# Altium footprint library MH_DA_THU_VIEN_16122016.PcbLib: 531 footprints (part 15 of 34)
Each footprint in its own frame and in the unit in brackets; x right, y up, seen from the top. Pads: shape width x height; smd on the part's side, far side on the other; paste and mask are expansions set on the pad; w line width, h text height; cw(c..) or ccw(c..) is an arc to the next point about the centre after c.
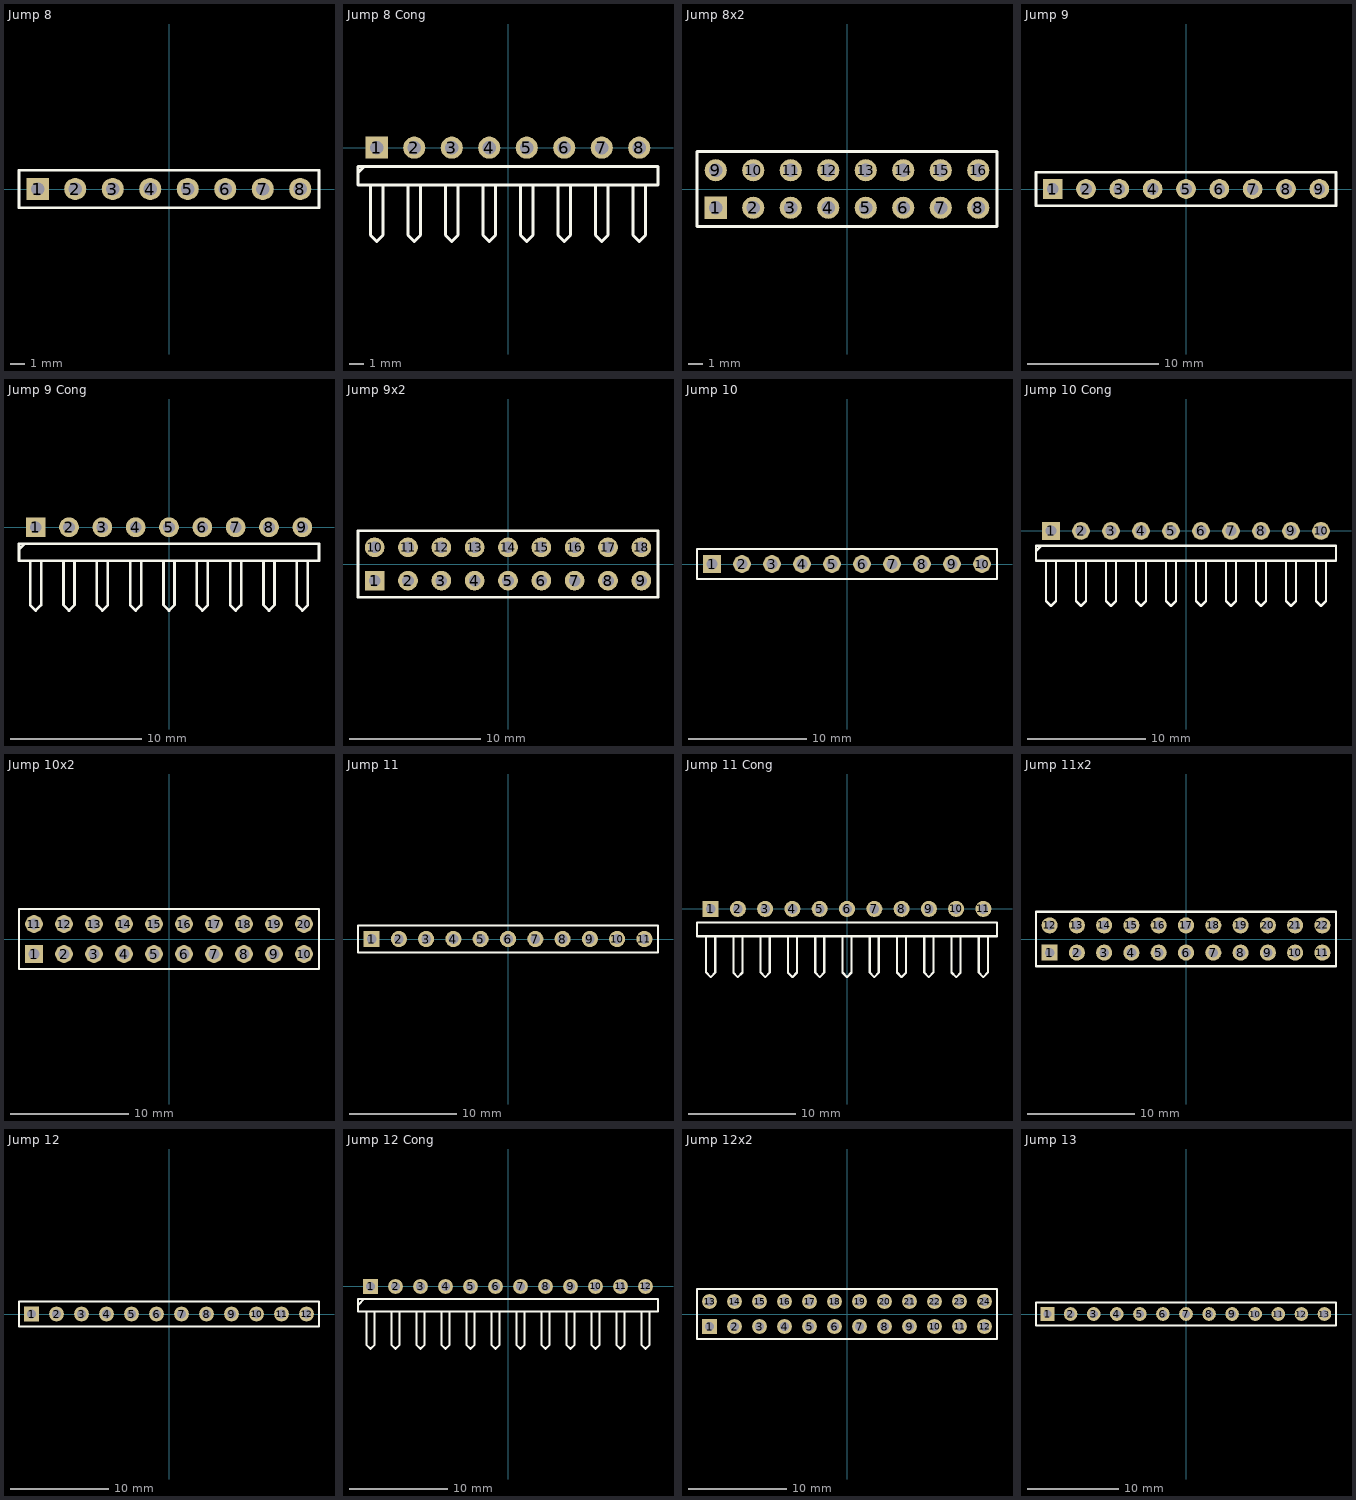
[diagram p14: the footprints below, top view; thin cyan lines are the x and y axes]

## Jump 8 [mm]
pads (8):
  rect 1.5x1.5 hole 0.9: 1(-8.89,0)
  round 1.5 hole 0.9: 2(-6.35,0) 3(-3.81,0) 4(-1.27,0) 5(1.27,0) 6(3.81,0) 7(6.35,0) 8(8.89,0)
Top Overlay:
  lines w0.2: -10.16,-1.27 -10.16,1.27 10.16,1.27 10.16,-1.27 -10.16,-1.27
3D body: height 7, standoff -1, extent 3.404,-0.406 4.2,0.392
3D body: height 1.5, standoff 0, extent 2.54,-1.27 5.08,1.27
3D body: height 7, standoff -1, extent 5.944,-0.406 6.74,0.392
3D body: height 1.5, standoff 0, extent 5.08,-1.27 7.62,1.27
3D body: height 7, standoff -1, extent 8.484,-0.406 9.28,0.392
3D body: height 1.5, standoff 0, extent 7.62,-1.27 10.16,1.27
3D body: height 7, standoff -1, extent -9.296,-0.406 -8.5,0.392
3D body: height 1.5, standoff 0, extent -10.16,-1.27 -7.62,1.27
3D body: height 7, standoff -1, extent -6.756,-0.406 -5.96,0.392
3D body: height 1.5, standoff 0, extent -7.62,-1.27 -5.08,1.27
3D body: height 7, standoff -1, extent -4.216,-0.406 -3.42,0.392
3D body: height 1.5, standoff 0, extent -5.08,-1.27 -2.54,1.27
3D body: height 7, standoff -1, extent -1.676,-0.406 -0.88,0.392
3D body: height 1.5, standoff 0, extent -2.54,-1.27 0,1.27
3D body: height 7, standoff -1, extent 0.864,-0.406 1.66,0.392
3D body: height 1.5, standoff 0, extent 0,-1.27 2.54,1.27

## Jump 8 Cong [mm]
pads (8):
  rect 1.5x1.5 hole 0.9: 1(-8.89,0)
  round 1.5 hole 0.9: 2(-6.35,0) 3(-3.81,0) 4(-1.27,0) 5(1.27,0) 6(3.81,0) 7(6.35,0) 8(8.89,0)
Top Overlay:
  lines w0.2: -10.16,-1.693 -9.737,-1.27 ; -9.313,-2.54 -9.313,-5.927 -8.89,-6.35 -8.467,-5.927 -8.467,-2.54 ; -6.773,-2.54 -6.773,-5.927 -6.35,-6.35 -5.927,-5.927 -5.927,-2.54 ; -4.233,-2.54 -4.233,-5.927 -3.81,-6.35 -3.387,-5.927 -3.387,-2.54 ; -1.693,-2.54 -1.693,-5.927 -1.27,-6.35 -0.847,-5.927 -0.847,-2.54 ; 0.847,-2.54 0.847,-5.927 1.27,-6.35 1.693,-5.927 1.693,-2.54 ; 3.387,-2.54 3.387,-5.927 3.81,-6.35 4.233,-5.927 4.233,-2.54 ; 5.927,-2.54 5.927,-5.927 6.35,-6.35 6.773,-5.927 6.773,-2.54 ; 8.467,-2.54 8.467,-5.927 8.89,-6.35 9.313,-5.927 9.313,-2.54 ; -10.16,-2.54 10.16,-2.54 10.16,-1.27 -10.16,-1.27 -10.16,-2.54
3D body: height 4.33, standoff -3, extent 5.08,-7 10.16,1.27
3D body: height 4.33, standoff -3, extent 0,-7 5.08,1.27
3D body: height 4.33, standoff -3, extent -5.08,-7 0,1.27
3D body: height 4.33, standoff -3, extent -10.16,-7 -5.08,1.27

## Jump 8x2 [mm]
pads (16):
  rect 1.5x1.5 hole 0.9: 1(-8.89,-1.27)
  round 1.5 hole 0.9: 2(-6.35,-1.27) 3(-3.81,-1.27) 4(-1.27,-1.27) 5(1.27,-1.27) 6(3.81,-1.27) 7(6.35,-1.27) 8(8.89,-1.27) 9(-8.89,1.27) 10(-6.35,1.27) 11(-3.81,1.27) 12(-1.27,1.27) 13(1.27,1.27) 14(3.81,1.27) 15(6.35,1.27) 16(8.89,1.27)
Top Overlay:
  lines w0.2: -10.16,-2.54 10.16,-2.54 10.16,2.54 -10.16,2.54 -10.16,-2.54
3D body: height 1.5, standoff 0, extent -10.16,-2.54 -7.62,0
3D body: height 1.5, standoff 0, extent -10.16,0 -7.62,2.54
3D body: height 1.5, standoff 0, extent -7.62,-2.54 -5.08,0
3D body: height 1.5, standoff 0, extent -7.62,0 -5.08,2.54
3D body: height 1.5, standoff 0, extent -5.08,-2.54 -2.54,0
3D body: height 1.5, standoff 0, extent -5.08,0 -2.54,2.54
3D body: height 1.5, standoff 0, extent -2.54,-2.54 0,0
3D body: height 1.5, standoff 0, extent -2.54,0 0,2.54
3D body: height 1.5, standoff 0, extent 0,-2.54 2.54,0
3D body: height 1.5, standoff 0, extent 0,0 2.54,2.54
3D body: height 1.5, standoff 0, extent 2.54,-2.54 5.08,0
3D body: height 1.5, standoff 0, extent 2.54,0 5.08,2.54
3D body: height 1.5, standoff 0, extent 5.08,-2.54 7.62,0
3D body: height 1.5, standoff 0, extent 5.08,0 7.62,2.54
3D body: height 1.5, standoff 0, extent 7.62,-2.54 10.16,0
3D body: height 1.5, standoff 0, extent 7.62,0 10.16,2.54

## Jump 9 [mm]
pads (9):
  rect 1.5x1.5 hole 0.9: 1(-10.16,0)
  round 1.5 hole 0.9: 2(-7.62,0) 3(-5.08,0) 4(-2.54,0) 5(0,0) 6(2.54,0) 7(5.08,0) 8(7.62,0) 9(10.16,0)
Top Overlay:
  lines w0.2: -11.43,-1.27 -11.43,1.27 11.43,1.27 11.43,-1.27 -11.43,-1.27
3D body: height 7, standoff -1, extent 2.134,-0.406 2.93,0.392
3D body: height 1.5, standoff 0, extent 1.27,-1.27 3.81,1.27
3D body: height 7, standoff -1, extent 4.674,-0.406 5.47,0.392
3D body: height 1.5, standoff 0, extent 3.81,-1.27 6.35,1.27
3D body: height 7, standoff -1, extent 7.214,-0.406 8.01,0.392
3D body: height 1.5, standoff 0, extent 6.35,-1.27 8.89,1.27
3D body: height 7, standoff -1, extent 9.754,-0.406 10.55,0.392
3D body: height 1.5, standoff 0, extent 8.89,-1.27 11.43,1.27
3D body: height 7, standoff -1, extent -10.566,-0.406 -9.77,0.392
3D body: height 1.5, standoff 0, extent -11.43,-1.27 -8.89,1.27
3D body: height 7, standoff -1, extent -8.026,-0.406 -7.23,0.392
3D body: height 1.5, standoff 0, extent -8.89,-1.27 -6.35,1.27
3D body: height 7, standoff -1, extent -5.486,-0.406 -4.69,0.392
3D body: height 1.5, standoff 0, extent -6.35,-1.27 -3.81,1.27
3D body: height 7, standoff -1, extent -2.946,-0.406 -2.15,0.392
3D body: height 1.5, standoff 0, extent -3.81,-1.27 -1.27,1.27
3D body: height 7, standoff -1, extent -0.406,-0.406 0.39,0.392
3D body: height 1.5, standoff 0, extent -1.27,-1.27 1.27,1.27

## Jump 9 Cong [mm]
pads (9):
  rect 1.5x1.5 hole 0.9: 1(-10.16,0)
  round 1.5 hole 0.9: 2(-7.62,0) 3(-5.08,0) 4(-2.54,0) 5(0,0) 6(2.54,0) 7(5.08,0) 8(7.62,0) 9(10.16,0)
Top Overlay:
  lines w0.2: -11.43,-1.693 -11.007,-1.27 ; -10.583,-2.54 -10.583,-5.927 -10.16,-6.35 -9.737,-5.927 -9.737,-2.54 ; -8.043,-2.54 -8.043,-5.927 -7.62,-6.35 -7.197,-5.927 -7.197,-2.54 ; -5.503,-2.54 -5.503,-5.927 -5.08,-6.35 -4.657,-5.927 -4.657,-2.54 ; -2.963,-2.54 -2.963,-5.927 -2.54,-6.35 -2.117,-5.927 -2.117,-2.54 ; -0.423,-2.54 -0.423,-5.927 0,-6.35 0.423,-5.927 0.423,-2.54 ; 2.117,-2.54 2.117,-5.927 2.54,-6.35 2.963,-5.927 2.963,-2.54 ; 4.657,-2.54 4.657,-5.927 5.08,-6.35 5.503,-5.927 5.503,-2.54 ; 7.197,-2.54 7.197,-5.927 7.62,-6.35 8.043,-5.927 8.043,-2.54 ; 9.737,-2.54 9.737,-5.927 10.16,-6.35 10.583,-5.927 10.583,-2.54 ; -11.43,-2.54 -11.43,-1.27 11.43,-1.27 11.43,-2.54 -11.43,-2.54
3D body: height 4.33, standoff -3, extent -1.27,-7 3.81,1.27
3D body: height 4.33, standoff -3, extent -6.35,-7 -1.27,1.27
3D body: height 4.33, standoff -3, extent -11.43,-7 -6.35,1.27
3D body: height 4.33, standoff -3, extent 3.81,-7 11.43,1.27

## Jump 9x2 [mm]
pads (18):
  rect 1.5x1.5 hole 0.9: 1(-10.16,-1.27)
  round 1.5 hole 0.9: 2(-7.62,-1.27) 3(-5.08,-1.27) 4(-2.54,-1.27) 5(0,-1.27) 6(2.54,-1.27) 7(5.08,-1.27) 8(7.62,-1.27) 9(10.16,-1.27) 10(-10.16,1.27) 11(-7.62,1.27) 12(-5.08,1.27) 13(-2.54,1.27) 14(0,1.27) 15(2.54,1.27) 16(5.08,1.27) 17(7.62,1.27) 18(10.16,1.27)
Top Overlay:
  lines w0.2: -11.43,-2.54 11.43,-2.54 11.43,2.54 -11.43,2.54 -11.43,-2.54
3D body: height 1.5, standoff 0, extent -11.43,-2.54 -8.89,0
3D body: height 1.5, standoff 0, extent -11.43,0 -8.89,2.54
3D body: height 1.5, standoff 0, extent -8.89,-2.54 -6.35,0
3D body: height 1.5, standoff 0, extent -8.89,0 -6.35,2.54
3D body: height 1.5, standoff 0, extent -6.35,-2.54 -3.81,0
3D body: height 1.5, standoff 0, extent -6.35,0 -3.81,2.54
3D body: height 1.5, standoff 0, extent -3.81,-2.54 -1.27,0
3D body: height 1.5, standoff 0, extent -3.81,0 -1.27,2.54
3D body: height 1.5, standoff 0, extent -1.27,-2.54 1.27,0
3D body: height 1.5, standoff 0, extent -1.27,0 1.27,2.54
3D body: height 1.5, standoff 0, extent 1.27,-2.54 3.81,0
3D body: height 1.5, standoff 0, extent 1.27,0 3.81,2.54
3D body: height 1.5, standoff 0, extent 3.81,-2.54 6.35,0
3D body: height 1.5, standoff 0, extent 3.81,0 6.35,2.54
3D body: height 1.5, standoff 0, extent 6.35,-2.54 8.89,0
3D body: height 1.5, standoff 0, extent 6.35,0 8.89,2.54
3D body: height 1.5, standoff 0, extent 8.89,-2.54 11.43,0
3D body: height 1.5, standoff 0, extent 8.89,0 11.43,2.54

## Jump 10 [mm]
pads (10):
  rect 1.5x1.5 hole 0.9: 1(-11.43,0)
  round 1.5 hole 0.9: 2(-8.89,0) 3(-6.35,0) 4(-3.81,0) 5(-1.27,0) 6(1.27,0) 7(3.81,0) 8(6.35,0) 9(8.89,0) 10(11.43,0)
Top Overlay:
  lines w0.2: -12.7,-1.27 -12.7,1.27 -10.795,1.27 12.7,1.27 12.7,-1.27 -12.7,-1.27
3D body: height 1.5, standoff 0, extent -2.54,-1.27 0,1.27
3D body: height 7, standoff -1, extent -1.676,-0.406 -0.88,0.392
3D body: height 1.5, standoff 0, extent -5.08,-1.27 -2.54,1.27
3D body: height 7, standoff -1, extent -4.216,-0.406 -3.42,0.392
3D body: height 1.5, standoff 0, extent -7.62,-1.27 -5.08,1.27
3D body: height 7, standoff -1, extent -6.756,-0.406 -5.96,0.392
3D body: height 1.5, standoff 0, extent -10.16,-1.27 -7.62,1.27
3D body: height 7, standoff -1, extent -9.296,-0.406 -8.5,0.392
3D body: height 1.5, standoff 0, extent -12.7,-1.27 -10.16,1.27
3D body: height 7, standoff -1, extent -11.836,-0.406 -11.04,0.392
3D body: height 1.5, standoff 0, extent 10.16,-1.27 12.7,1.27
3D body: height 7, standoff -1, extent 11.024,-0.406 11.82,0.392
3D body: height 1.5, standoff 0, extent 7.62,-1.27 10.16,1.27
3D body: height 7, standoff -1, extent 8.484,-0.406 9.28,0.392
3D body: height 1.5, standoff 0, extent 5.08,-1.27 7.62,1.27
3D body: height 7, standoff -1, extent 5.944,-0.406 6.74,0.392
3D body: height 1.5, standoff 0, extent 2.54,-1.27 5.08,1.27
3D body: height 7, standoff -1, extent 3.404,-0.406 4.2,0.392
3D body: height 1.5, standoff 0, extent 0,-1.27 2.54,1.27
3D body: height 7, standoff -1, extent 0.864,-0.406 1.66,0.392

## Jump 10 Cong [mm]
pads (10):
  rect 1.5x1.5 hole 0.9: 1(-11.43,0)
  round 1.5 hole 0.9: 2(-8.89,0) 3(-6.35,0) 4(-3.81,0) 5(-1.27,0) 6(1.27,0) 7(3.81,0) 8(6.35,0) 9(8.89,0) 10(11.43,0)
Top Overlay:
  lines w0.2: -12.7,-1.693 -12.277,-1.27 ; -11.853,-2.54 -11.853,-5.927 -11.43,-6.35 -11.007,-5.927 -11.007,-2.54 ; -9.313,-2.54 -9.313,-5.927 -8.89,-6.35 -8.467,-5.927 -8.467,-2.54 ; -6.773,-2.54 -6.773,-5.927 -6.35,-6.35 -5.927,-5.927 -5.927,-2.54 ; -4.233,-2.54 -4.233,-5.927 -3.81,-6.35 -3.387,-5.927 -3.387,-2.54 ; -1.693,-2.54 -1.693,-5.927 -1.27,-6.35 -0.847,-5.927 -0.847,-2.54 ; 0.847,-2.54 0.847,-5.927 1.27,-6.35 1.693,-5.927 1.693,-2.54 ; 3.387,-2.54 3.387,-5.927 3.81,-6.35 4.233,-5.927 4.233,-2.54 ; 5.927,-2.54 5.927,-5.927 6.35,-6.35 6.773,-5.927 6.773,-2.54 ; 8.467,-2.54 8.467,-5.927 8.89,-6.35 9.313,-5.927 9.313,-2.54 ; 11.007,-2.54 11.007,-5.927 11.43,-6.35 11.853,-5.927 11.853,-2.54 ; -12.7,-2.54 12.7,-2.54 12.7,-1.27 -10.795,-1.27 -12.7,-1.27 -12.7,-2.54
3D body: height 4.33, standoff -3, extent 7.62,-7 12.7,1.27
3D body: height 4.33, standoff -3, extent 2.54,-7 7.62,1.27
3D body: height 4.33, standoff -3, extent -2.54,-7 2.54,1.27
3D body: height 4.33, standoff -3, extent -7.62,-7 -2.54,1.27
3D body: height 4.33, standoff -3, extent -12.7,-7 -7.62,1.27

## Jump 10x2 [mm]
pads (20):
  rect 1.5x1.5 hole 0.9: 1(-11.43,-1.27)
  round 1.5 hole 0.9: 2(-8.89,-1.27) 3(-6.35,-1.27) 4(-3.81,-1.27) 5(-1.27,-1.27) 6(1.27,-1.27) 7(3.81,-1.27) 8(6.35,-1.27) 9(8.89,-1.27) 10(11.43,-1.27) 11(-11.43,1.27) 12(-8.89,1.27) 13(-6.35,1.27) 14(-3.81,1.27) 15(-1.27,1.27) 16(1.27,1.27) 17(3.81,1.27) 18(6.35,1.27) 19(8.89,1.27) 20(11.43,1.27)
Top Overlay:
  lines w0.2: -12.7,-2.54 -10.795,-2.54 12.7,-2.54 12.7,2.54 -10.795,2.54 -12.7,2.54 -12.7,-2.54
3D body: height 1.5, standoff 0, extent 10.16,0 12.7,2.54
3D body: height 1.5, standoff 0, extent 10.16,-2.54 12.7,0
3D body: height 1.5, standoff 0, extent 7.62,0 10.16,2.54
3D body: height 1.5, standoff 0, extent 7.62,-2.54 10.16,0
3D body: height 1.5, standoff 0, extent 5.08,0 7.62,2.54
3D body: height 1.5, standoff 0, extent 5.08,-2.54 7.62,0
3D body: height 1.5, standoff 0, extent 2.54,0 5.08,2.54
3D body: height 1.5, standoff 0, extent 2.54,-2.54 5.08,0
3D body: height 1.5, standoff 0, extent 0,0 2.54,2.54
3D body: height 1.5, standoff 0, extent 0,-2.54 2.54,0
3D body: height 1.5, standoff 0, extent -2.54,0 0,2.54
3D body: height 1.5, standoff 0, extent -2.54,-2.54 0,0
3D body: height 1.5, standoff 0, extent -5.08,0 -2.54,2.54
3D body: height 1.5, standoff 0, extent -5.08,-2.54 -2.54,0
3D body: height 1.5, standoff 0, extent -7.62,0 -5.08,2.54
3D body: height 1.5, standoff 0, extent -7.62,-2.54 -5.08,0
3D body: height 1.5, standoff 0, extent -10.16,0 -7.62,2.54
3D body: height 1.5, standoff 0, extent -10.16,-2.54 -7.62,0
3D body: height 1.5, standoff 0, extent -12.573,-0.127 -10.033,2.413
3D body: height 1.5, standoff 0, extent -12.573,-2.667 -10.033,-0.127
3D body: height 7, standoff -1, extent -11.828,0.871 -11.032,1.669
3D body: height 7, standoff -1, extent -9.288,0.871 -8.492,1.669
3D body: height 7, standoff -1, extent -6.748,0.871 -5.952,1.669
3D body: height 7, standoff -1, extent -4.208,0.871 -3.412,1.669
3D body: height 7, standoff -1, extent -1.668,0.871 -0.872,1.669
3D body: height 7, standoff -1, extent 0.872,0.871 1.668,1.669
3D body: height 7, standoff -1, extent 3.412,0.871 4.208,1.669
3D body: height 7, standoff -1, extent 5.952,0.871 6.748,1.669
3D body: height 7, standoff -1, extent 8.492,0.871 9.288,1.669
3D body: height 7, standoff -1, extent 11.032,0.871 11.828,1.669
3D body: height 7, standoff -1, extent -11.828,-1.669 -11.032,-0.871
3D body: height 7, standoff -1, extent -9.288,-1.669 -8.492,-0.871
3D body: height 7, standoff -1, extent -6.748,-1.669 -5.952,-0.871
3D body: height 7, standoff -1, extent -4.208,-1.669 -3.412,-0.871
3D body: height 7, standoff -1, extent -1.668,-1.669 -0.872,-0.871
3D body: height 7, standoff -1, extent 0.872,-1.669 1.668,-0.871
3D body: height 7, standoff -1, extent 3.412,-1.669 4.208,-0.871
3D body: height 7, standoff -1, extent 5.952,-1.669 6.748,-0.871
3D body: height 7, standoff -1, extent 8.492,-1.669 9.288,-0.871
3D body: height 7, standoff -1, extent 11.032,-1.669 11.828,-0.871

## Jump 11 [mm]
pads (11):
  rect 1.5x1.5 hole 0.9: 1(-12.7,0)
  round 1.5 hole 0.9: 2(-10.16,0) 3(-7.62,0) 4(-5.08,0) 5(-2.54,0) 6(0,0) 7(2.54,0) 8(5.08,0) 9(7.62,0) 10(10.16,0) 11(12.7,0)
Top Overlay:
  lines w0.2: -13.97,-1.27 13.97,-1.27 13.97,1.27 -12.065,1.27 -13.97,1.27 -13.97,-1.27
3D body: height 1.5, standoff 0, extent -3.81,-1.27 -1.27,1.27
3D body: height 7, standoff -1, extent -2.946,-0.406 -2.15,0.392
3D body: height 1.5, standoff 0, extent -6.35,-1.27 -3.81,1.27
3D body: height 7, standoff -1, extent -5.486,-0.406 -4.69,0.392
3D body: height 1.5, standoff 0, extent -8.89,-1.27 -6.35,1.27
3D body: height 7, standoff -1, extent -8.026,-0.406 -7.23,0.392
3D body: height 1.5, standoff 0, extent -11.43,-1.27 -8.89,1.27
3D body: height 7, standoff -1, extent -10.566,-0.406 -9.77,0.392
3D body: height 1.5, standoff 0, extent -13.97,-1.27 -11.43,1.27
3D body: height 7, standoff -1, extent -13.106,-0.406 -12.31,0.392
3D body: height 1.5, standoff 0, extent 8.89,-1.27 11.43,1.27
3D body: height 7, standoff -1, extent 9.754,-0.406 10.55,0.392
3D body: height 1.5, standoff 0, extent 6.35,-1.27 8.89,1.27
3D body: height 7, standoff -1, extent 7.214,-0.406 8.01,0.392
3D body: height 1.5, standoff 0, extent 3.81,-1.27 6.35,1.27
3D body: height 7, standoff -1, extent 4.674,-0.406 5.47,0.392
3D body: height 1.5, standoff 0, extent 1.27,-1.27 3.81,1.27
3D body: height 7, standoff -1, extent 2.134,-0.406 2.93,0.392
3D body: height 1.5, standoff 0, extent -1.27,-1.27 1.27,1.27
3D body: height 7, standoff -1, extent -0.406,-0.406 0.39,0.392
3D body: height 1.5, standoff 0, extent 11.43,-1.27 13.97,1.27
3D body: height 7, standoff -1, extent 12.294,-0.406 13.09,0.392

## Jump 11 Cong [mm]
pads (11):
  rect 1.5x1.5 hole 0.9: 1(-12.7,0)
  round 1.5 hole 0.9: 2(-10.16,0) 3(-7.62,0) 4(-5.08,0) 5(-2.54,0) 6(0,0) 7(2.54,0) 8(5.08,0) 9(7.62,0) 10(10.16,0) 11(12.7,0)
Top Overlay:
  lines w0.2: -13.123,-2.54 -13.123,-5.927 -12.7,-6.35 -12.277,-5.927 -12.277,-2.54 ; -10.583,-2.54 -10.583,-5.927 -10.16,-6.35 -9.737,-5.927 -9.737,-2.54 ; -8.043,-2.54 -8.043,-5.927 -7.62,-6.35 -7.197,-5.927 -7.197,-2.54 ; -5.503,-2.54 -5.503,-5.927 -5.08,-6.35 -4.657,-5.927 -4.657,-2.54 ; -2.963,-2.54 -2.963,-5.927 -2.54,-6.35 -2.117,-5.927 -2.117,-2.54 ; -0.423,-2.54 -0.423,-5.927 0,-6.35 0.423,-5.927 0.423,-2.54 ; 2.117,-2.54 2.117,-5.927 2.54,-6.35 2.963,-5.927 2.963,-2.54 ; 4.657,-2.54 4.657,-5.927 5.08,-6.35 5.503,-5.927 5.503,-2.54 ; 7.197,-2.54 7.197,-5.927 7.62,-6.35 8.043,-5.927 8.043,-2.54 ; 9.737,-2.54 9.737,-5.927 10.16,-6.35 10.583,-5.927 10.583,-2.54 ; 12.277,-2.54 12.277,-5.927 12.7,-6.35 13.123,-5.927 13.123,-2.54 ; -13.97,-2.54 -13.97,-1.27 13.97,-1.27 13.97,-2.54 -13.97,-2.54
3D body: height 4.33, standoff -3, extent 6.35,-7 13.97,1.27
3D body: height 4.33, standoff -3, extent 1.27,-7 6.35,1.27
3D body: height 4.33, standoff -3, extent -3.81,-7 1.27,1.27
3D body: height 4.33, standoff -3, extent -8.89,-7 -3.81,1.27
3D body: height 4.33, standoff -3, extent -13.97,-7 -8.89,1.27

## Jump 11x2 [mm]
pads (22):
  rect 1.5x1.5 hole 0.9: 1(-12.7,-1.27)
  round 1.5 hole 0.9: 2(-10.16,-1.27) 3(-7.62,-1.27) 4(-5.08,-1.27) 5(-2.54,-1.27) 6(0,-1.27) 7(2.54,-1.27) 8(5.08,-1.27) 9(7.62,-1.27) 10(10.16,-1.27) 11(12.7,-1.27) 12(-12.7,1.27) 13(-10.16,1.27) 14(-7.62,1.27) 15(-5.08,1.27) 16(-2.54,1.27) 17(0,1.27) 18(2.54,1.27) 19(5.08,1.27) 20(7.62,1.27) 21(10.16,1.27) 22(12.7,1.27)
Top Overlay:
  lines w0.2: -13.97,-2.54 -13.97,2.54 13.97,2.54 13.97,-2.54 -13.97,-2.54
3D body: height 1.5, standoff 0, extent -13.97,-2.54 -11.43,0
3D body: height 1.5, standoff 0, extent -13.97,0 -11.43,2.54
3D body: height 1.5, standoff 0, extent -11.43,-2.54 -8.89,0
3D body: height 1.5, standoff 0, extent -11.43,0 -8.89,2.54
3D body: height 1.5, standoff 0, extent -8.89,-2.54 -6.35,0
3D body: height 1.5, standoff 0, extent -8.89,0 -6.35,2.54
3D body: height 1.5, standoff 0, extent -6.35,-2.54 -3.81,0
3D body: height 1.5, standoff 0, extent -6.35,0 -3.81,2.54
3D body: height 1.5, standoff 0, extent -3.81,-2.54 -1.27,0
3D body: height 1.5, standoff 0, extent -3.81,0 -1.27,2.54
3D body: height 1.5, standoff 0, extent -1.27,-2.54 1.27,0
3D body: height 1.5, standoff 0, extent -1.27,0 1.27,2.54
3D body: height 1.5, standoff 0, extent 1.27,-2.54 3.81,0
3D body: height 1.5, standoff 0, extent 1.27,0 3.81,2.54
3D body: height 1.5, standoff 0, extent 3.81,-2.54 6.35,0
3D body: height 1.5, standoff 0, extent 3.81,0 6.35,2.54
3D body: height 1.5, standoff 0, extent 6.35,-2.54 8.89,0
3D body: height 1.5, standoff 0, extent 6.35,0 8.89,2.54
3D body: height 1.5, standoff 0, extent 8.89,-2.54 11.43,0
3D body: height 1.5, standoff 0, extent 8.89,0 11.43,2.54
3D body: height 1.5, standoff 0, extent 11.43,-2.54 13.97,0
3D body: height 1.5, standoff 0, extent 11.43,0 13.97,2.54

## Jump 12 [mm]
pads (12):
  rect 1.5x1.5 hole 0.9: 1(-13.97,0)
  round 1.5 hole 0.9: 2(-11.43,0) 3(-8.89,0) 4(-6.35,0) 5(-3.81,0) 6(-1.27,0) 7(1.27,0) 8(3.81,0) 9(6.35,0) 10(8.89,0) 11(11.43,0) 12(13.97,0)
Top Overlay:
  lines w0.2: -15.24,-1.27 15.24,-1.27 15.24,1.27 -13.335,1.27 -15.24,1.27 -15.24,-1.27
3D body: height 1.5, standoff 0, extent -5.08,-1.27 -2.54,1.27
3D body: height 7, standoff -1, extent -4.216,-0.406 -3.42,0.392
3D body: height 1.5, standoff 0, extent -7.62,-1.27 -5.08,1.27
3D body: height 7, standoff -1, extent -6.756,-0.406 -5.96,0.392
3D body: height 1.5, standoff 0, extent -10.16,-1.27 -7.62,1.27
3D body: height 7, standoff -1, extent -9.296,-0.406 -8.5,0.392
3D body: height 1.5, standoff 0, extent -12.7,-1.27 -10.16,1.27
3D body: height 7, standoff -1, extent -11.836,-0.406 -11.04,0.392
3D body: height 1.5, standoff 0, extent -15.24,-1.27 -12.7,1.27
3D body: height 7, standoff -1, extent -14.376,-0.406 -13.58,0.392
3D body: height 1.5, standoff 0, extent 7.62,-1.27 10.16,1.27
3D body: height 7, standoff -1, extent 8.484,-0.406 9.28,0.392
3D body: height 1.5, standoff 0, extent 5.08,-1.27 7.62,1.27
3D body: height 7, standoff -1, extent 5.944,-0.406 6.74,0.392
3D body: height 1.5, standoff 0, extent 2.54,-1.27 5.08,1.27
3D body: height 7, standoff -1, extent 3.404,-0.406 4.2,0.392
3D body: height 1.5, standoff 0, extent 0,-1.27 2.54,1.27
3D body: height 7, standoff -1, extent 0.864,-0.406 1.66,0.392
3D body: height 1.5, standoff 0, extent -2.54,-1.27 0,1.27
3D body: height 7, standoff -1, extent -1.676,-0.406 -0.88,0.392
3D body: height 1.5, standoff 0, extent 12.7,-1.27 15.24,1.27
3D body: height 7, standoff -1, extent 13.564,-0.406 14.36,0.392
3D body: height 1.5, standoff 0, extent 10.16,-1.27 12.7,1.27
3D body: height 7, standoff -1, extent 11.024,-0.406 11.82,0.392

## Jump 12 Cong [mm]
pads (12):
  rect 1.5x1.5 hole 0.9: 1(-13.97,0)
  round 1.5 hole 0.9: 2(-11.43,0) 3(-8.89,0) 4(-6.35,0) 5(-3.81,0) 6(-1.27,0) 7(1.27,0) 8(3.81,0) 9(6.35,0) 10(8.89,0) 11(11.43,0) 12(13.97,0)
Top Overlay:
  lines w0.2: -15.24,-1.905 -14.605,-1.27 ; -14.393,-2.54 -14.393,-5.927 -13.97,-6.35 -13.547,-5.927 -13.547,-2.54 ; -11.853,-2.54 -11.853,-5.927 -11.43,-6.35 -11.007,-5.927 -11.007,-2.54 ; -9.313,-2.54 -9.313,-5.927 -8.89,-6.35 -8.467,-5.927 -8.467,-2.54 ; -6.773,-2.54 -6.773,-5.927 -6.35,-6.35 -5.927,-5.927 -5.927,-2.54 ; -4.233,-2.54 -4.233,-5.927 -3.81,-6.35 -3.387,-5.927 -3.387,-2.54 ; -1.693,-2.54 -1.693,-5.927 -1.27,-6.35 -0.847,-5.927 -0.847,-2.54 ; 0.847,-2.54 0.847,-5.927 1.27,-6.35 1.693,-5.927 1.693,-2.54 ; 3.387,-2.54 3.387,-5.927 3.81,-6.35 4.233,-5.927 4.233,-2.54 ; 5.927,-2.54 5.927,-5.927 6.35,-6.35 6.773,-5.927 6.773,-2.54 ; 8.467,-2.54 8.467,-5.927 8.89,-6.35 9.313,-5.927 9.313,-2.54 ; 11.007,-2.54 11.007,-5.927 11.43,-6.35 11.853,-5.927 11.853,-2.54 ; 13.547,-2.54 13.547,-5.927 13.97,-6.35 14.393,-5.927 14.393,-2.54 ; -15.24,-2.54 15.24,-2.54 15.24,-1.27 -13.335,-1.27 -15.24,-1.27 -15.24,-2.54
3D body: height 4.33, standoff -3, extent 0,-7 5.08,1.27
3D body: height 4.33, standoff -3, extent -5.08,-7 0,1.27
3D body: height 4.33, standoff -3, extent -10.16,-7 -5.08,1.27
3D body: height 4.33, standoff -3, extent -15.24,-7 -10.16,1.27
3D body: height 4.33, standoff -3, extent 5.08,-7 10.16,1.27
3D body: height 4.33, standoff -3, extent 10.16,-7 15.24,1.27

## Jump 12x2 [mm]
pads (24):
  rect 1.5x1.5 hole 0.9: 1(-13.97,-1.27)
  round 1.5 hole 0.9: 2(-11.43,-1.27) 3(-8.89,-1.27) 4(-6.35,-1.27) 5(-3.81,-1.27) 6(-1.27,-1.27) 7(1.27,-1.27) 8(3.81,-1.27) 9(6.35,-1.27) 10(8.89,-1.27) 11(11.43,-1.27) 12(13.97,-1.27) 13(-13.97,1.27) 14(-11.43,1.27) 15(-8.89,1.27) 16(-6.35,1.27) 17(-3.81,1.27) 18(-1.27,1.27) 19(1.27,1.27) 20(3.81,1.27) 21(6.35,1.27) 22(8.89,1.27) 23(11.43,1.27) 24(13.97,1.27)
Top Overlay:
  lines w0.2: -15.24,-2.54 -15.24,2.54 15.24,2.54 15.24,-2.54 -15.24,-2.54
3D body: height 1.5, standoff 0, extent 12.7,-2.54 15.24,0
3D body: height 1.5, standoff 0, extent 12.7,0 15.24,2.54
3D body: height 1.5, standoff 0, extent 10.16,0 12.7,2.54
3D body: height 1.5, standoff 0, extent 10.16,-2.54 12.7,0
3D body: height 1.5, standoff 0, extent 7.62,0 10.16,2.54
3D body: height 1.5, standoff 0, extent 7.62,-2.54 10.16,0
3D body: height 1.5, standoff 0, extent 5.08,0 7.62,2.54
3D body: height 1.5, standoff 0, extent 5.08,-2.54 7.62,0
3D body: height 1.5, standoff 0, extent 2.54,0 5.08,2.54
3D body: height 1.5, standoff 0, extent 2.54,-2.54 5.08,0
3D body: height 1.5, standoff 0, extent 0,0 2.54,2.54
3D body: height 1.5, standoff 0, extent 0,-2.54 2.54,0
3D body: height 1.5, standoff 0, extent -2.54,0 0,2.54
3D body: height 1.5, standoff 0, extent -2.54,-2.54 0,0
3D body: height 1.5, standoff 0, extent -5.08,0 -2.54,2.54
3D body: height 1.5, standoff 0, extent -5.08,-2.54 -2.54,0
3D body: height 1.5, standoff 0, extent -7.62,0 -5.08,2.54
3D body: height 1.5, standoff 0, extent -7.62,-2.54 -5.08,0
3D body: height 1.5, standoff 0, extent -10.16,0 -7.62,2.54
3D body: height 1.5, standoff 0, extent -10.16,-2.54 -7.62,0
3D body: height 1.5, standoff 0, extent -12.7,0 -10.16,2.54
3D body: height 1.5, standoff 0, extent -12.7,-2.54 -10.16,0
3D body: height 1.5, standoff 0, extent -15.24,0 -12.7,2.54
3D body: height 1.5, standoff 0, extent -15.24,-2.54 -12.7,0
3D body: height 7, standoff -1, extent -14.453,0.838 -13.656,1.637
3D body: height 7, standoff -1, extent -14.453,-1.702 -13.656,-0.903
3D body: height 7, standoff -1, extent -11.913,0.838 -11.116,1.637
3D body: height 7, standoff -1, extent -11.913,-1.702 -11.116,-0.903
3D body: height 7, standoff -1, extent -9.373,-1.702 -8.576,-0.903
3D body: height 7, standoff -1, extent -9.373,0.838 -8.576,1.637
3D body: height 7, standoff -1, extent -6.833,0.838 -6.036,1.637
3D body: height 7, standoff -1, extent -6.833,-1.702 -6.036,-0.903
3D body: height 7, standoff -1, extent -4.208,-1.669 -3.411,-0.871
3D body: height 7, standoff -1, extent -4.293,0.838 -3.496,1.637
3D body: height 7, standoff -1, extent -1.753,-1.702 -0.956,-0.903
3D body: height 7, standoff -1, extent -1.753,0.838 -0.956,1.637
3D body: height 7, standoff -1, extent 0.787,0.838 1.584,1.637
3D body: height 7, standoff -1, extent 0.787,-1.702 1.584,-0.903
3D body: height 7, standoff -1, extent 3.327,-1.702 4.124,-0.903
3D body: height 7, standoff -1, extent 3.327,0.838 4.124,1.637
3D body: height 7, standoff -1, extent 5.867,0.838 6.664,1.637
3D body: height 7, standoff -1, extent 5.867,-1.702 6.664,-0.903
3D body: height 7, standoff -1, extent 8.407,-1.702 9.204,-0.903
3D body: height 7, standoff -1, extent 8.407,0.838 9.204,1.637
3D body: height 7, standoff -1, extent 10.947,0.838 11.744,1.637
3D body: height 7, standoff -1, extent 10.947,-1.702 11.744,-0.903
3D body: height 7, standoff -1, extent 13.487,-1.702 14.284,-0.903
3D body: height 7, standoff -1, extent 13.487,0.838 14.284,1.637

## Jump 13 [mm]
pads (13):
  rect 1.5x1.5 hole 0.9: 1(-15.24,0)
  round 1.5 hole 0.9: 2(-12.7,0) 3(-10.16,0) 4(-7.62,0) 5(-5.08,0) 6(-2.54,0) 7(0,0) 8(2.54,0) 9(5.08,0) 10(7.62,0) 11(10.16,0) 12(12.7,0) 13(15.24,0)
Top Overlay:
  lines w0.2: -16.51,-1.27 -16.51,1.27 -14.605,1.27 16.51,1.27 16.51,-1.27 -16.51,-1.27
3D body: height 1.5, standoff 0, extent -6.35,-1.27 -3.81,1.27
3D body: height 7, standoff -1, extent -5.486,-0.406 -4.69,0.392
3D body: height 1.5, standoff 0, extent -8.89,-1.27 -6.35,1.27
3D body: height 7, standoff -1, extent -8.026,-0.406 -7.23,0.392
3D body: height 1.5, standoff 0, extent -11.43,-1.27 -8.89,1.27
3D body: height 7, standoff -1, extent -10.566,-0.406 -9.77,0.392
3D body: height 1.5, standoff 0, extent -13.97,-1.27 -11.43,1.27
3D body: height 7, standoff -1, extent -13.106,-0.406 -12.31,0.392
3D body: height 1.5, standoff 0, extent -16.51,-1.27 -13.97,1.27
3D body: height 7, standoff -1, extent -15.646,-0.406 -14.85,0.392
3D body: height 1.5, standoff 0, extent 6.35,-1.27 8.89,1.27
3D body: height 7, standoff -1, extent 7.214,-0.406 8.01,0.392
3D body: height 1.5, standoff 0, extent 3.81,-1.27 6.35,1.27
3D body: height 7, standoff -1, extent 4.674,-0.406 5.47,0.392
3D body: height 1.5, standoff 0, extent 1.27,-1.27 3.81,1.27
3D body: height 7, standoff -1, extent 2.134,-0.406 2.93,0.392
3D body: height 1.5, standoff 0, extent -1.27,-1.27 1.27,1.27
3D body: height 7, standoff -1, extent -0.406,-0.406 0.39,0.392
3D body: height 1.5, standoff 0, extent -3.81,-1.27 -1.27,1.27
3D body: height 7, standoff -1, extent -2.946,-0.406 -2.15,0.392
3D body: height 1.5, standoff 0, extent 13.97,-1.27 16.51,1.27
3D body: height 7, standoff -1, extent 14.834,-0.406 15.63,0.392
3D body: height 1.5, standoff 0, extent 11.43,-1.27 13.97,1.27
3D body: height 7, standoff -1, extent 12.294,-0.406 13.09,0.392
3D body: height 1.5, standoff 0, extent 8.89,-1.27 11.43,1.27
3D body: height 7, standoff -1, extent 9.754,-0.406 10.55,0.392